# Altium footprint library alex_footprint.PcbLib: 262 footprints (part 6 of 17)
Each footprint in its own frame and in the unit in brackets; x right, y up, seen from the top. Pads: shape width x height; smd on the part's side, far side on the other; paste and mask are expansions set on the pad; w line width, h text height; cw(c..) or ccw(c..) is an arc to the next point about the centre after c.
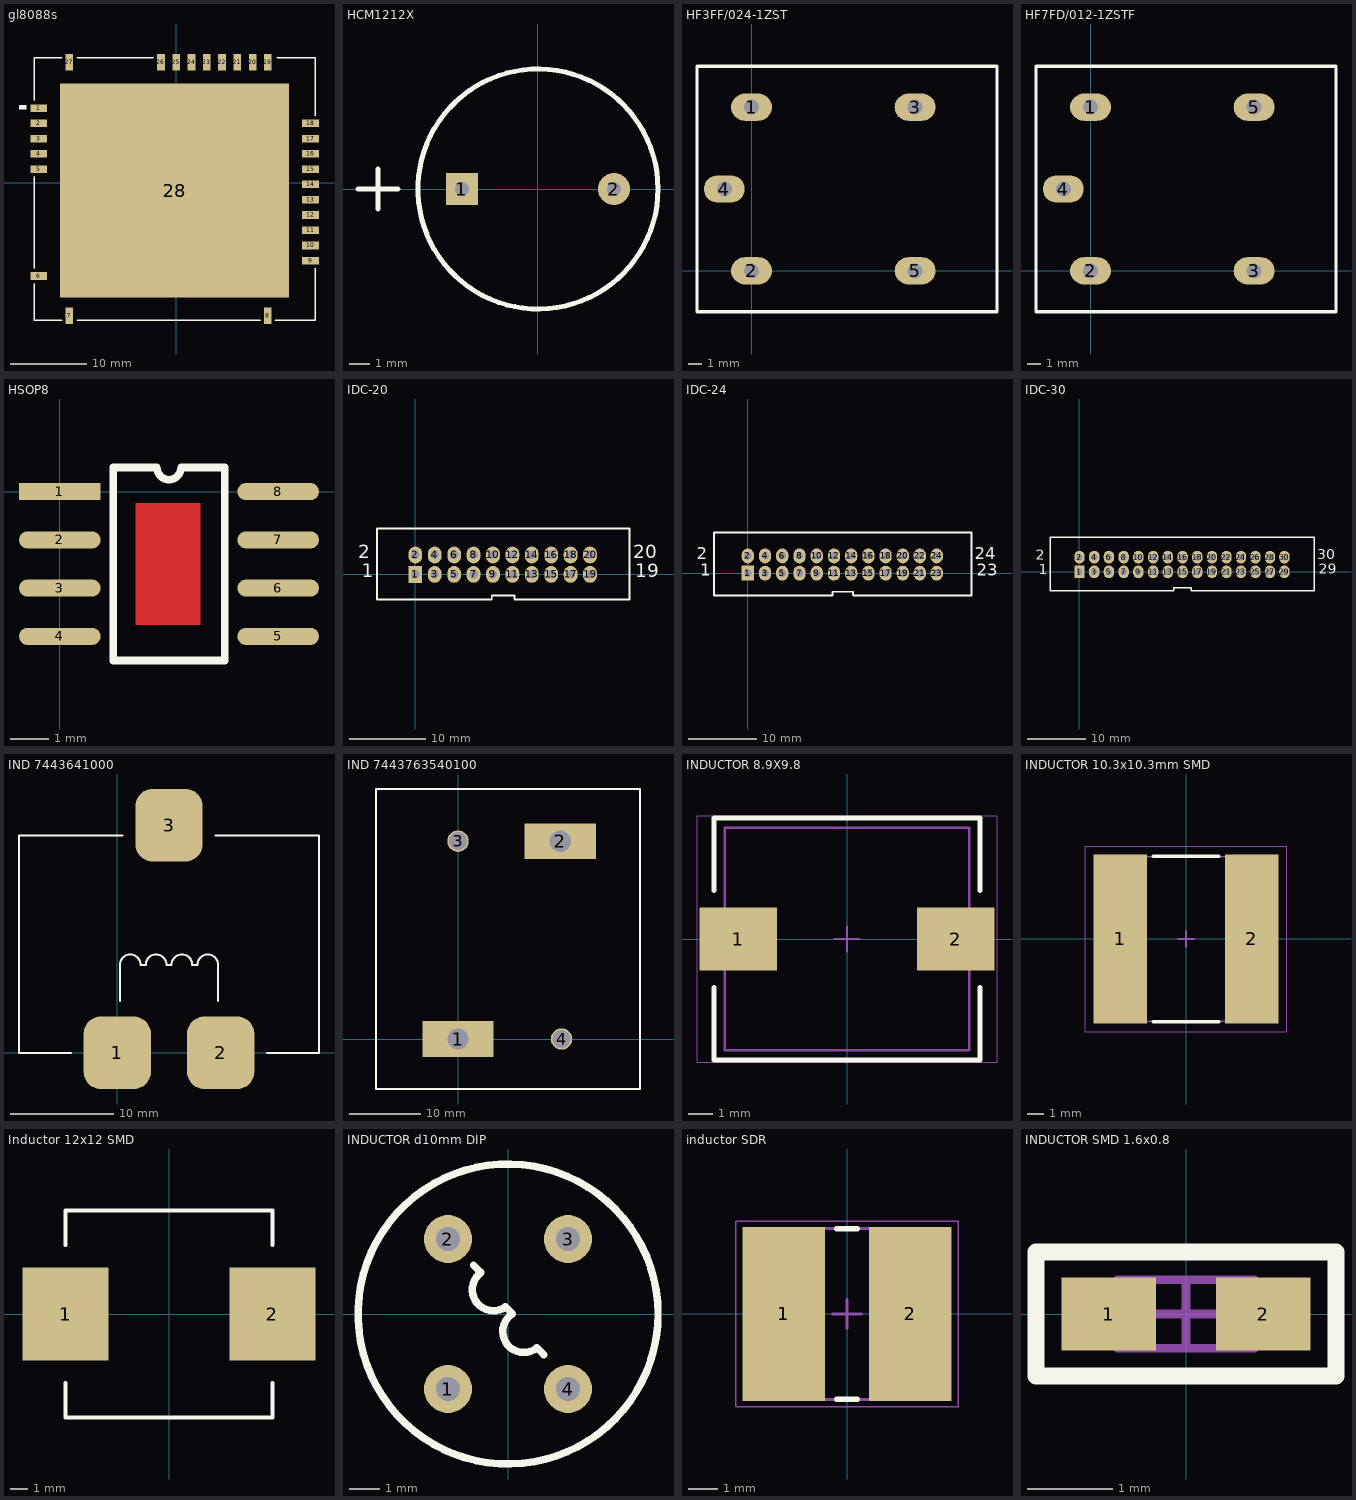
[diagram p5: the footprints below, top view; thin cyan lines are the x and y axes]

## gl8088s [mm]
pads (28):
  rect 2.2x1 smd: 1(-18,9.8) 2(-18,7.8) 3(-18,5.8) 4(-18,3.8) 5(-18,1.8) 6(-18,-12.2) 9(17.6,-10.2) 10(17.6,-8.2) 11(17.6,-6.2) 12(17.6,-4.2) 13(17.6,-2.2) 14(17.6,-0.2) 15(17.6,1.8) 16(17.6,3.8) 17(17.6,5.8) 18(17.6,7.8)
  rect 1x2.2 smd: 7(-14,-17.4) 8(12,-17.4) 19(12,15.8) 20(10,15.8) 21(8,15.8) 22(6,15.8) 23(4,15.8) 24(2,15.8) 25(0,15.8) 26(-2,15.8) 27(-14,15.8)
  rect 30x28 smd: 28(-0.2,-1)
Top Overlay:
  rectangle: -20.6,9.6 -19.6,10.2
  lines w0.2: -18.6,-13.2 -18.6,-18 -18.4,-18 -15,-18 ; -18.6,-11.2 -18.6,0.8 ; -18.6,10.8 -18.6,15.8 -18.6,16.4 -15,16.4 ; -13,-18 11,-18 ; -13,16.4 -3,16.4 ; 13,-18 18.2,-18 18.2,-11.2 ; 13.2,16.4 18.2,16.4 18.2,8.8

## HCM1212X [mm]
pads (2):
  rect 1.6x1.6 hole 0.7 unplated: 1(-3.8,0)
  round 1.6 hole 0.7 unplated: 2(3.8,0)
Top Overlay:
  circle w0.25: c0,0 r6
  lines w0.25: -9,0 -7,0 ; -8,-1 -8,1

## HF3FF/024-1ZST [mm]
height 15
pads (5):
  oval 3x2 hole 1.1 unplated: 1(0,12) 2(0,0) 3(12,12) 4(-2,6) 5(12,0)
Top Overlay:
  lines w0.254: -4,-3 18,-3 18,1 18,11 18,15 -4,15 -4,-3

## HF7FD/012-1ZSTF [mm]
height 15
pads (5):
  oval 3x2 hole 1.1 unplated: 1(0,12) 2(0,0) 3(12,0) 4(-2,6) 5(12,12)
Top Overlay:
  lines w0.254: -4,-3 -4,15 18,15 18,11 18,1 18,-3 -4,-3

## HSOP8 [mm]
pads (8):
  rect 2.15x0.45 smd: 1(0,0)
  oval 2.15x0.45 smd: 2(0,-1.27) 3(0,-2.54) 4(0,-3.81) 5(5.75,-3.81) 6(5.75,-2.54) 7(5.75,-1.27) 8(5.75,0)
Top Layer:
  region: 2,-0.3 3.7,-0.3 3.7,-3.5 2,-3.5
Top Overlay:
  lines w0.2: 1.41,-4.445 4.34,-4.445 4.34,0.635 3.193,0.635 cw(c2.875,0.635) 2.558,0.635 1.41,0.635 1.41,-0.635 1.41,-3.175 1.41,-4.445

## IDC-20 [mm]
pads (20):
  rect 1.8x2.2 hole 1.1: 1(0,0)
  oval 1.8x2.2 hole 1.1: 2(0,2.54) 3(2.54,0) 4(2.54,2.54) 5(5.08,0) 6(5.08,2.54) 7(7.62,0) 8(7.62,2.54) 9(10.16,0) 10(10.16,2.54) 11(12.7,0) 12(12.7,2.54) 13(15.24,0) 14(15.24,2.54) 15(17.78,0) 16(17.78,2.54) 17(20.32,0) 18(20.32,2.54) 19(22.86,0) 20(22.86,2.54)
Top Overlay:
  lines w0.254: -5,-3.29 9.96,-3.29 10,-3.25 10,-2.75 13,-2.75 13,-3.25 13.04,-3.29 28,-3.29 ; -5,-3.25 -5,6 28,6 28,3.175 28,-0.635 28,-3.25
  text "20" at 28.5,1.533 h3
  text "19" at 28.753,-0.967 h3
  text "2" at -7.5,1.5 h3
  text "1" at -6.997,-1 h3
Mechanical 7:
  text ".Designator" at 8.5,6 h1.5

## IDC-24 [mm]
pads (24):
  rect 1.8x2.2 hole 1.1: 1(0,0)
  oval 1.8x2.2 hole 1.1: 2(0,2.54) 3(2.54,0) 4(2.54,2.54) 5(5.08,0) 6(5.08,2.54) 7(7.62,0) 8(7.62,2.54) 9(10.16,0) 10(10.16,2.54) 11(12.7,0) 12(12.7,2.54) 13(15.24,0) 14(15.24,2.54) 15(17.78,0) 16(17.78,2.54) 17(20.32,0) 18(20.32,2.54) 19(22.86,0) 20(22.86,2.54) 21(25.36,0) 22(25.36,2.54) 23(27.86,0) 24(27.86,2.54)
Top Overlay:
  lines w0.254: -5,-3.29 12.5,-3.29 ; -5,-3.25 -5,6 33,6 33,3.175 33,-0.635 33,-3.25 ; 12.5,-3.25 12.5,-2.75 15.5,-2.75 15.5,-3.25 ; 15.54,-3.25 15.58,-3.29 33,-3.29
  text "1" at -6.997,-1 h3
  text "2" at -7.5,1.5 h3
  text "23" at 33.75,-0.967 h3
  text "24" at 33.5,1.5 h3
Mechanical 7:
  text ".Designator" at 12.7,7.62 h1.5

## IDC-30 [mm]
pads (30):
  rect 1.8x2.2 hole 1.1: 1(0,0)
  oval 1.8x2.2 hole 1.1: 2(0,2.54) 3(2.54,0) 4(2.54,2.54) 5(5.08,0) 6(5.08,2.54) 7(7.62,0) 8(7.62,2.54) 9(10.16,0) 10(10.16,2.54) 11(12.7,0) 12(12.7,2.54) 13(15.24,0) 14(15.24,2.54) 15(17.78,0) 16(17.78,2.54) 17(20.32,0) 18(20.32,2.54) 19(22.86,0) 20(22.86,2.54) 21(25.36,0) 22(25.36,2.54) 23(27.86,0) 24(27.86,2.54) 25(30.36,0) 26(30.36,2.54) 27(32.86,0) 28(32.86,2.54) 29(35.36,0) 30(35.36,2.54)
Top Overlay:
  lines w0.254: -5,-3.29 16.25,-3.29 ; -5,-3.25 -5,6 40.5,6 40.5,3.175 40.5,-0.635 40.5,-3.25 ; 16.25,-3.25 16.25,-2.75 19.25,-2.75 19.25,-3.25 ; 19.29,-3.25 19.33,-3.29 40.5,-3.29
  text "1" at -6.997,-1 h3
  text "2" at -7.5,1.5 h3
  text "29" at 41.25,-0.967 h3
  text "30" at 41,1.533 h3

## IND 7443641000 [mm]
pads (3):
  rrect50% 6.5x7 smd mask+0.25: 1(0,0) 2(10,0) 3(5,22)
Top Overlay:
  lines w0.2: -4.5,0 -9.5,0 -9.5,21 0.5,21 ; 0.25,5 0.25,8.5 cw(c1.25,8.5) 1.25,9.5 ; 9.5,21 19.5,21 19.5,0 14.5,0 ; 9.75,5 9.75,8.5 ccw(c8.75,8.5) 8.75,9.5 ; 1.25,9.5 cw(c1.25,8.5) 2.25,8.5 2.75,8.5 cw(c3.75,8.5) 3.75,9.5 ; 1.25,9.5 1.25,9.5 ; 3.75,9.5 cw(c3.75,8.5) 4.75,8.5 5.25,8.5 cw(c6.25,8.5) 6.25,9.5 ; 3.75,9.5 3.75,9.5 ; 6.25,9.5 cw(c6.25,8.5) 7.25,8.5 7.75,8.5 cw(c8.75,8.5) 8.75,9.5 ; 6.25,9.5 6.25,9.5 ; 8.75,9.5 8.75,9.5
3D body "Inductor 7443641000.stp": height 19.7, standoff 0.3, extent -9,1.5 19,20

## IND 7443763540100 [mm]
pads (4):
  rect 10x5 hole 3 square unplated mask+0.25: 1(0,0) 2(14.3,27.7)
  round 3 hole 2.5 unplated mask+0.25: 3(0,27.7) 4(14.5,0)
Top Overlay:
  lines w0.2: 14.3,27.7 cw(c14.3,27.4) 14.6,27.4
  lines w0.3: -11.5,-7 25.5,-7 25.5,35 -11.5,35 -11.5,-7
3D body "Inductor 7443763540100.stp": height 36, standoff -2.5, extent -10.75,-7 25.25,34

## INDUCTOR 8.9X9.8 [mm]
height 5
pads (2):
  rect 3.2x2.6 smd: 1(-4.5,0) 2(4.5,0)
Top Overlay:
  lines w0.2: -5.5,-2 -5.5,-5 5.5,-5 5.5,-2 ; -5.5,2 -5.5,5 5.5,5 5.5,2
Mechanical 13:
  lines w0.1: -5.05,-4.6 -5.05,4.6 5.05,4.6 5.05,-4.6 -5.05,-4.6
Mechanical 15:
  lines w0.05: -6.2,-5.1 -6.2,5.1 6.2,5.1 6.2,-5.1 -6.2,-5.1
  lines w0.1: -0.5,0 0.5,0 ; 0,-0.5 0,0.5
3D body: height 5, standoff 0, extent -3.05,-4.6 3.05,4.6
3D body: height 5, standoff 0, extent -5.05,-4.6 -3.05,4.6
3D body: height 5, standoff 0, extent 3.05,-4.6 5.05,4.6

## INDUCTOR 10.3x10.3mm SMD [mm]
height 6.35
pads (2):
  rect 3.35x10.54 smd: 1(-4.105,0) 2(4.105,0)
Top Overlay:
  lines w0.2: -2.05,-5.17 2.05,-5.17 ; -2.05,5.17 2.05,5.17
Mechanical 13:
  lines w0.1: -5.15,-5.15 -5.15,5.15 5.15,5.15 5.15,-5.15 -5.15,-5.15
Mechanical 15:
  lines w0.05: -6.3,-5.8 -6.3,5.8 6.3,5.8 6.3,-5.8 -6.3,-5.8
  lines w0.1: -0.5,0 0.5,0 ; 0,-0.5 0,0.5
3D body: height 6.35, standoff 0, extent -2.5,-5.15 2.5,5.15
3D body: height 6.35, standoff 0, extent -5.15,-5.15 -2.5,5.15
3D body: height 6.35, standoff 0, extent 2.5,-5.15 5.15,5.15

## Inductor 12x12 SMD [mm]
height 8
pads (2):
  rect 5x5.4 smd: 1(-6,0) 2(6,0)
Top Overlay:
  lines w0.254: -6,-4 -6,-6 6,-6 6,-4 ; -6,4 -6,6 6,6 6,4

## INDUCTOR d10mm DIP [mm]
pads (4):
  round 1.6 hole 0.8 unplated mask+0.25: 1(-2,-2.5) 2(-2,2.5) 3(2,2.5) 4(2,-2.5)
Top Overlay:
  circle w0.25: c0,0 r5
  lines w0.25: -1.15,1.625 -0.916,1.391 ; -0.9,1.375 ccw(c-0.492,0.809) -0.084,0.243 0.15,0.009 ccw(c0.525,-0.582) 0.966,-1.124 1.2,-1.357

## inductor SDR [mm] "Precision Wire Wound Inductor, 2-Leads, Body 5,80x5,80mm, IPC Medium Density"
height 5
pads (2):
  rect 2.8x5.9 smd: 1(-2.15,0) 2(2.15,0)
Top Overlay:
  lines w0.2: -0.35,-2.9 0.35,-2.9 ; -0.35,2.9 0.35,2.9
Mechanical 13:
  lines w0.1: -2.9,-2.9 -2.9,2.9 2.9,2.9 2.9,-2.9 -2.9,-2.9
Mechanical 15:
  lines w0.05: -3.775,-3.15 -3.775,3.15 3.775,3.15 3.775,-3.15 -3.775,-3.15
  lines w0.1: -0.5,0 0.5,0 ; 0,-0.5 0,0.5
3D body: height 5, standoff 0, extent -2.9,-2.9 2.9,2.9

## INDUCTOR SMD 1.6x0.8 [mm]
height 0.8
pads (2):
  rect 1.1x0.85 smd: 1(-0.9,0) 2(0.9,0)
Top Overlay:
  lines w0.2: -1.75,-0.725 1.75,-0.725 1.75,0.725 -1.75,0.725 -1.75,-0.725
Mechanical 13:
  lines w0.1: -0.8,-0.4 0.8,-0.4 0.8,0.4 -0.8,0.4 -0.8,-0.4
Mechanical 15:
  lines w0.1: -0.4,0 0.4,0 ; 0,-0.4 0,0.4
3D body: height 0.8, standoff 0, extent -0.8,-0.4 0.8,0.4